# Altium footprint library Zmod.PcbLib: 229 footprints (part 13 of 15)
Each footprint in its own frame and in the unit in brackets; x right, y up, seen from the top. Pads: shape width x height; smd on the part's side, far side on the other; paste and mask are expansions set on the pad; w line width, h text height; cw(c..) or ccw(c..) is an arc to the next point about the centre after c.
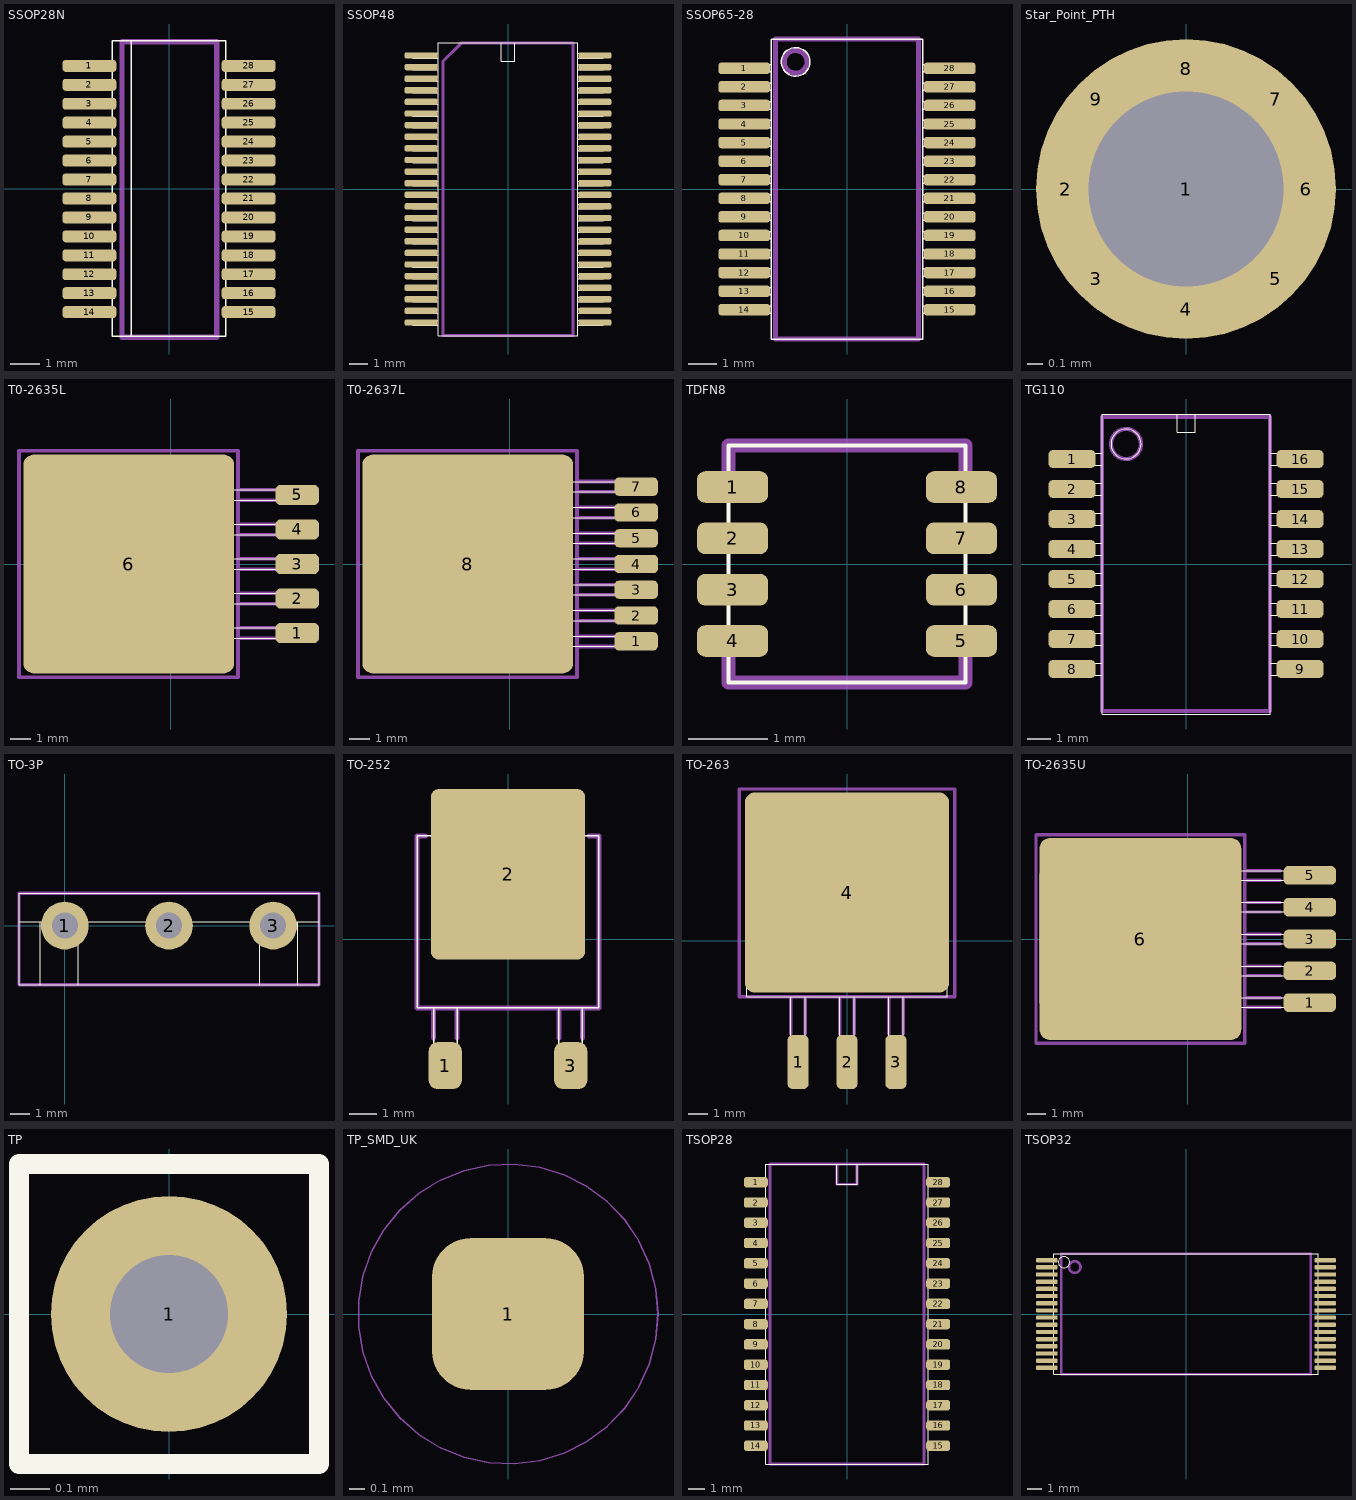
[diagram p12: the footprints below, top view; thin cyan lines are the x and y axes]

## SSOP28N [mm]
height 2.54
pads (28):
  rrect50% 1.8x0.4 smd paste+0: 1(-2.667,4.115) 2(-2.667,3.48) 3(-2.667,2.845) 4(-2.667,2.21) 5(-2.667,1.575) 6(-2.667,0.94) 7(-2.667,0.305) 8(-2.667,-0.33) 9(-2.667,-0.965) 10(-2.667,-1.6) 11(-2.667,-2.235) 12(-2.667,-2.87) 13(-2.667,-3.505) 14(-2.667,-4.14) 15(2.667,-4.14) 16(2.667,-3.505) 17(2.667,-2.87) 18(2.667,-2.235) 19(2.667,-1.6) 20(2.667,-0.965) 21(2.667,-0.33) 22(2.667,0.305) 23(2.667,0.94) 24(2.667,1.575) 25(2.667,2.21) 26(2.667,2.845) 27(2.667,3.48) 28(2.667,4.115)
Top Overlay:
  lines w0.05: -1.905,-4.267 -3.048,-4.267 -3.048,-4.013 -1.905,-4.013 ; -1.905,-3.632 -3.048,-3.632 -3.048,-3.378 -1.905,-3.378 ; -1.905,-2.997 -3.048,-2.997 -3.048,-2.743 -1.905,-2.743 ; -1.905,-2.362 -3.048,-2.362 -3.048,-2.108 -1.905,-2.108 ; -1.905,-1.727 -3.048,-1.727 -3.048,-1.473 -1.905,-1.473 ; -1.905,-1.092 -3.048,-1.092 -3.048,-0.838 -1.905,-0.838 ; -1.905,-0.457 -3.048,-0.457 -3.048,-0.203 -1.905,-0.203 ; -1.905,0.178 -3.048,0.178 -3.048,0.432 -1.905,0.432 ; -1.905,0.813 -3.048,0.813 -3.048,1.067 -1.905,1.067 ; -1.905,1.448 -3.048,1.448 -3.048,1.702 -1.905,1.702 ; -1.905,2.083 -3.048,2.083 -3.048,2.337 -1.905,2.337 ; -1.905,2.718 -3.048,2.718 -3.048,2.972 -1.905,2.972 ; -1.905,3.353 -3.048,3.353 -3.048,3.607 -1.905,3.607 ; -1.905,3.988 -3.048,3.988 -3.048,4.242 -1.905,4.242 ; -1.27,-4.953 -1.27,4.953 ; 1.905,-4.267 3.048,-4.267 3.048,-4.013 1.905,-4.013 ; 1.905,-3.632 3.048,-3.632 3.048,-3.378 1.905,-3.378 ; 1.905,-2.997 3.048,-2.997 3.048,-2.743 1.905,-2.743 ; 1.905,-2.362 3.048,-2.362 3.048,-2.108 1.905,-2.108 ; 1.905,-1.727 3.048,-1.727 3.048,-1.473 1.905,-1.473 ; 1.905,-1.092 3.048,-1.092 3.048,-0.838 1.905,-0.838 ; 1.905,-0.457 3.048,-0.457 3.048,-0.203 1.905,-0.203 ; 1.905,0.178 3.048,0.178 3.048,0.432 1.905,0.432 ; 1.905,0.813 3.048,0.813 3.048,1.067 1.905,1.067 ; 1.905,1.448 3.048,1.448 3.048,1.702 1.905,1.702 ; 1.905,2.083 3.048,2.083 3.048,2.337 1.905,2.337 ; 1.905,2.718 3.048,2.718 3.048,2.972 1.905,2.972 ; 1.905,3.353 3.048,3.353 3.048,3.607 1.905,3.607 ; 1.905,3.988 3.048,3.988 3.048,4.242 1.905,4.242 ; -1.905,-4.953 -1.905,4.953 1.905,4.953 1.905,-4.953 -1.905,-4.953
Mechanical 15:
  lines w0.18: -1.577,-4.985 1.598,-4.985 1.598,4.921 -1.577,4.921 -1.577,-4.985
  text ".Designator" at -0.381,-4.445 h1.5

## SSOP48 [mm]
height 2.54
pads (48):
  rrect50% 1.8x0.35 smd paste+0: 1(-4.75,7.315) 2(-4.75,6.68) 3(-4.75,6.045) 4(-4.75,5.41) 5(-4.75,4.775) 6(-4.75,4.14) 7(-4.75,3.505) 8(-4.75,2.87) 9(-4.75,2.235) 10(-4.75,1.6) 11(-4.75,0.965) 12(-4.75,0.33) 13(-4.75,-0.305) 14(-4.75,-0.94) 15(-4.75,-1.575) 16(-4.75,-2.21) 17(-4.75,-2.845) 18(-4.75,-3.48) 19(-4.75,-4.115) 20(-4.75,-4.75) 21(-4.75,-5.385) 22(-4.75,-6.02) 23(-4.75,-6.655) 24(-4.75,-7.29) 25(4.75,-7.29) 26(4.75,-6.655) 27(4.75,-6.02) 28(4.75,-5.385) 29(4.75,-4.75) 30(4.75,-4.115) 31(4.75,-3.48) 32(4.75,-2.845) 33(4.75,-2.21) 34(4.75,-1.575) 35(4.75,-0.94) 36(4.75,-0.305) 37(4.75,0.33) 38(4.75,0.965) 39(4.75,1.6) 40(4.75,2.235) 41(4.75,2.87) 42(4.75,3.505) 43(4.75,4.14) 44(4.75,4.775) 45(4.75,5.41) 46(4.75,6.045) 47(4.75,6.68) 48(4.75,7.315)
Top Overlay:
  drawing of 151 lines, arcs and shapes, not listed
Mechanical 15:
  lines w0.18: -3.556,-8.001 3.556,-8.001 3.556,8.001 -2.54,8.001 -3.556,6.985 -3.556,-8.001
  text ".Designator" at -1.778,-7.493 h1.5

## SSOP65-28 [mm]
height 3.048
pads (28):
  rrect50% 1.8x0.4 smd paste+0: 1(-3.6,4.225) 2(-3.6,3.575) 3(-3.6,2.925) 4(-3.6,2.275) 5(-3.6,1.625) 6(-3.6,0.975) 7(-3.6,0.325) 8(-3.6,-0.325) 9(-3.6,-0.975) 10(-3.6,-1.625) 11(-3.6,-2.275) 12(-3.6,-2.925) 13(-3.6,-3.575) 14(-3.6,-4.225) 15(3.6,-4.225) 16(3.6,-3.575) 17(3.6,-2.925) 18(3.6,-2.275) 19(3.6,-1.625) 20(3.6,-0.975) 21(3.6,-0.325) 22(3.6,0.325) 23(3.6,0.975) 24(3.6,1.625) 25(3.6,2.275) 26(3.6,2.925) 27(3.6,3.575) 28(3.6,4.225)
Top Overlay:
  circle w0.05: c-1.8,4.45 r0.5
  lines w0.05: -2.65,-4.35 -3.9,-4.35 -3.9,-4.1 -2.65,-4.1 ; -2.65,-3.7 -3.9,-3.7 -3.9,-3.45 -2.65,-3.45 ; -2.65,-3.05 -3.9,-3.05 -3.9,-2.8 -2.65,-2.8 ; -2.65,-2.4 -3.9,-2.4 -3.9,-2.15 -2.65,-2.15 ; -2.65,-1.75 -3.9,-1.75 -3.9,-1.5 -2.65,-1.5 ; -2.65,-1.1 -3.9,-1.1 -3.9,-0.85 -2.65,-0.85 ; -2.65,-0.45 -3.9,-0.45 -3.9,-0.2 -2.65,-0.2 ; -2.65,0.2 -3.9,0.2 -3.9,0.45 -2.65,0.45 ; -2.65,0.85 -3.9,0.85 -3.9,1.1 -2.65,1.1 ; -2.65,1.5 -3.9,1.5 -3.9,1.75 -2.65,1.75 ; -2.65,2.15 -3.9,2.15 -3.9,2.4 -2.65,2.4 ; -2.65,2.8 -3.9,2.8 -3.9,3.05 -2.65,3.05 ; -2.65,3.45 -3.9,3.45 -3.9,3.7 -2.65,3.7 ; -2.65,4.1 -3.9,4.1 -3.9,4.35 -2.65,4.35 ; 2.65,-4.35 3.9,-4.35 3.9,-4.1 2.65,-4.1 ; 2.65,-3.7 3.9,-3.7 3.9,-3.45 2.65,-3.45 ; 2.65,-3.05 3.9,-3.05 3.9,-2.8 2.65,-2.8 ; 2.65,-2.4 3.9,-2.4 3.9,-2.15 2.65,-2.15 ; 2.65,-1.75 3.9,-1.75 3.9,-1.5 2.65,-1.5 ; 2.65,-1.1 3.9,-1.1 3.9,-0.85 2.65,-0.85 ; 2.65,-0.45 3.9,-0.45 3.9,-0.2 2.65,-0.2 ; 2.65,0.2 3.9,0.2 3.9,0.45 2.65,0.45 ; 2.65,0.85 3.9,0.85 3.9,1.1 2.65,1.1 ; 2.65,1.5 3.9,1.5 3.9,1.75 2.65,1.75 ; 2.65,2.15 3.9,2.15 3.9,2.4 2.65,2.4 ; 2.65,2.8 3.9,2.8 3.9,3.05 2.65,3.05 ; 2.65,3.45 3.9,3.45 3.9,3.7 2.65,3.7 ; 2.65,4.1 3.9,4.1 3.9,4.35 2.65,4.35 ; -2.65,-5.25 2.65,-5.25 2.65,5.25 -2.65,5.25 -2.65,-5.25
Mechanical 15:
  circle w0.18: c-1.8,4.45 r0.4
  lines w0.18: -2.5,-5.25 -2.5,5.25 2.5,5.25 2.5,-5.25 -2.5,-5.25
  text ".Designator" at -1.143,-4.826 h1.5

## Star_Point_PTH [mm] "Star Point  Rev. 2"
height 0.01
pads (9):
  round 2 hole 1.3: 1(0,0)
  round 0.3 all layers, no hole: 2(-0.8,0) 3(-0.6,-0.6) 4(0,-0.8) 5(0.6,-0.6) 6(0.8,0) 7(0.6,0.6) 8(0,0.8) 9(-0.6,0.6)
Mechanical 15:
  text ".Designator" at 0,0 h1.5

## T0-2635L [mm]
height 4.699
pads (6):
  rrect50% 2.15x1 smd: 1(6.223,-3.404) 2(6.223,-1.702) 3(6.223,0) 4(6.223,1.702) 5(6.223,3.404)
  rrect10% 10.4x10.8 smd: 6(-2.083,0)
Top Overlay:
  circle w0.05: c1.905,-4.064 r0.635
  lines w0.05: -5.893,-5.08 -5.893,5.08 ; 2.997,-3.658 7.188,-3.658 7.188,-3.15 2.997,-3.15 ; 2.997,-1.956 7.188,-1.956 7.188,-1.448 2.997,-1.448 ; 2.997,-0.254 7.188,-0.254 7.188,0.254 2.997,0.254 ; 2.997,1.448 7.188,1.448 7.188,1.956 2.997,1.956 ; 2.997,3.15 7.188,3.15 7.188,3.658 2.997,3.658 ; -7.163,-3.429 -6.782,-5.08 2.997,-5.08 2.997,5.08 -6.782,5.08 -7.163,3.429 -7.163,-3.429
Mechanical 15:
  lines w0.18: 3.302,-3.658 5.207,-3.658 ; 3.302,-3.15 5.207,-3.15 ; 3.302,-1.956 5.207,-1.956 ; 3.302,-1.448 5.207,-1.448 ; 3.302,-0.254 5.207,-0.254 ; 3.302,0.254 5.207,0.254 ; 3.302,1.448 5.207,1.448 ; 3.302,1.956 5.207,1.956 ; 3.302,3.15 5.207,3.15 ; 3.302,3.658 5.207,3.658 ; -7.493,-5.588 -7.493,5.588 3.302,5.588 3.302,-5.588 -7.493,-5.588
  text ".Designator" at -7.1,3.5 h1.5

## T0-2637L [mm]
height 4.699
pads (8):
  rrect50% 2.15x0.9 smd: 1(6.223,-3.81) 2(6.223,-2.54) 3(6.223,-1.27) 4(6.223,0) 5(6.223,1.27) 6(6.223,2.54) 7(6.223,3.81)
  rrect10% 10.4x10.8 smd: 8(-2.083,0)
Top Overlay:
  circle w0.05: c1.905,-4.064 r0.635
  lines w0.05: -5.893,-5.08 -5.893,5.08 ; 2.997,-4.064 7.188,-4.064 7.188,-3.556 2.997,-3.556 ; 2.997,-2.794 7.188,-2.794 7.188,-2.286 2.997,-2.286 ; 2.997,-1.524 7.188,-1.524 7.188,-1.016 2.997,-1.016 ; 2.997,-0.254 7.188,-0.254 7.188,0.254 2.997,0.254 ; 2.997,1.016 7.188,1.016 7.188,1.524 2.997,1.524 ; 2.997,2.286 7.188,2.286 7.188,2.794 2.997,2.794 ; 2.997,3.556 7.188,3.556 7.188,4.064 2.997,4.064 ; -7.163,-3.429 -6.782,-5.08 2.997,-5.08 2.997,5.08 -6.782,5.08 -7.163,3.429 -7.163,-3.429
Mechanical 15:
  lines w0.18: 3.302,-4.064 5.207,-4.064 ; 3.302,-3.556 5.207,-3.556 ; 3.302,-2.794 5.207,-2.794 ; 3.302,-2.286 5.207,-2.286 ; 3.302,-1.524 5.207,-1.524 ; 3.302,-1.016 5.207,-1.016 ; 3.302,-0.254 5.207,-0.254 ; 3.302,0.254 5.207,0.254 ; 3.302,1.016 5.207,1.016 ; 3.302,1.524 5.207,1.524 ; 3.302,2.286 5.207,2.286 ; 3.302,2.794 5.207,2.794 ; 3.302,3.556 5.207,3.556 ; 3.302,4.064 5.207,4.064 ; -7.493,-5.588 -7.493,5.588 3.302,5.588 3.302,-5.588 -7.493,-5.588
  text ".Designator" at -6.75,3.4 h1.5

## TDFN8 [mm]
height 1.905
pads (8):
  rrect50% 0.9x0.4 smd paste+0: 1(-1.45,0.975) 2(-1.45,0.325) 3(-1.45,-0.325) 4(-1.45,-0.975) 5(1.45,-0.975) 6(1.45,-0.325) 7(1.45,0.325) 8(1.45,0.975)
Top Overlay:
  lines w0.05: -1.5,-1.5 1.5,-1.5 1.5,1.5 -1.5,1.5 -1.5,-1.5
Mechanical 15:
  lines w0.18: -1.5,-1.2 -1.5,-1.5 1.5,-1.5 1.5,-1.2 ; -1.5,1.2 -1.5,1.5 1.5,1.5 1.5,1.2
  text ".Designator" at -1.397,0.381 h1.5

## TG110 [mm]
height 2.54
pads (16):
  rrect50% 2x0.75 smd paste+0: 1(-4.826,4.445) 2(-4.826,3.175) 3(-4.826,1.905) 4(-4.826,0.635) 5(-4.826,-0.635) 6(-4.826,-1.905) 7(-4.826,-3.175) 8(-4.826,-4.445) 9(4.826,-4.445) 10(4.826,-3.175) 11(4.826,-1.905) 12(4.826,-0.635) 13(4.826,0.635) 14(4.826,1.905) 15(4.826,3.175) 16(4.826,4.445)
Top Overlay:
  circle w0.05: c-2.54,5.08 r0.635
  lines w0.05: -3.556,-4.699 -4.826,-4.699 -4.826,-4.191 -3.556,-4.191 ; -3.556,-3.429 -4.826,-3.429 -4.826,-2.921 -3.556,-2.921 ; -3.556,-2.159 -4.826,-2.159 -4.826,-1.651 -3.556,-1.651 ; -3.556,-0.889 -4.826,-0.889 -4.826,-0.381 -3.556,-0.381 ; -3.556,0.381 -4.826,0.381 -4.826,0.889 -3.556,0.889 ; -3.556,1.651 -4.826,1.651 -4.826,2.159 -3.556,2.159 ; -3.556,2.921 -4.826,2.921 -4.826,3.429 -3.556,3.429 ; -3.556,4.191 -4.826,4.191 -4.826,4.699 -3.556,4.699 ; -0.381,6.35 -0.381,5.588 0.381,5.588 0.381,6.35 ; 3.556,-4.699 4.826,-4.699 4.826,-4.191 3.556,-4.191 ; 3.556,-3.429 4.826,-3.429 4.826,-2.921 3.556,-2.921 ; 3.556,-2.159 4.826,-2.159 4.826,-1.651 3.556,-1.651 ; 3.556,-0.889 4.826,-0.889 4.826,-0.381 3.556,-0.381 ; 3.556,0.381 4.826,0.381 4.826,0.889 3.556,0.889 ; 3.556,1.651 4.826,1.651 4.826,2.159 3.556,2.159 ; 3.556,2.921 4.826,2.921 4.826,3.429 3.556,3.429 ; 3.556,4.191 4.826,4.191 4.826,4.699 3.556,4.699 ; -3.556,-6.35 -3.556,6.35 3.556,6.35 3.556,-6.35 -3.556,-6.35
Mechanical 15:
  circle w0.18: c-2.54,5.08 r0.635
  lines w0.18: -3.556,-6.223 -3.556,6.223 3.556,6.223 3.556,-6.223 -3.556,-6.223
  text ".Designator" at -1.651,-5.334 h1.5

## TO-3P [mm] "Fairchild Package TO-3P"
height 24
pads (3):
  round 2.5 / inner round 1.35 / far side round 2.5 hole 1.35: 1(0,0) 2(5.45,0) 3(10.9,0)
Top Overlay:
  lines w0.05: -2.4,0.2 0.7,0.2 ; -1.3,-3.1 -1.3,0.2 ; 10.2,-3.1 10.2,0.2 ; 12.2,-3.1 12.2,0.2 ; 13.3,0.2 0.7,0.2 ; 0.7,-3.1 13.3,-3.1 13.3,1.7 -2.4,1.7 -2.4,-3.1 0.7,-3.1 ; 0.7,-3.1 0.7,0.2
Mechanical 15:
  lines w0.18: -2.4,-3.1 13.3,-3.1 13.3,1.7 -2.4,1.7 -2.4,-3.1
  text ".Designator" at -1.7,-2.3 h1.5

## TO-252 [mm]
height 2.413
pads (3):
  rrect50% 1.2x1.7 smd: 1(-2.28,-4.6) 3(2.28,-4.6)
  rrect10% 5.6x6.2 smd: 2(0,2.35)
Top Overlay:
  lines w0.05: -2.7,-4.1 -1.85,-4.1 ; -2.7,-2.5 -2.7,-4.95 -1.85,-4.95 -1.85,-2.5 ; -2.7,3.75 -2.7,4.95 -2,4.95 -2,4.6 2,4.6 2,4.95 2.7,4.95 2.7,3.75 ; 1.85,-4.1 2.7,-4.1 ; 1.85,-2.5 1.85,-4.95 2.7,-4.95 2.7,-2.5 ; -3.3,-2.5 3.3,-2.5 3.3,3.75 -3.3,3.75 -3.3,-2.5
Mechanical 15:
  lines w0.18: -3,3.75 -3.3,3.75 -3.3,-2.5 3.3,-2.5 3.3,3.75 2.95,3.75 ; -2.7,-3.6 -2.7,-2.5 ; -1.85,-3.6 -1.85,-2.5 ; 1.85,-3.6 1.85,-2.5 ; 2.7,-3.6 2.7,-2.5
  text ".Designator" at -3.4,2.45 h1.5

## TO-263 [mm]
height 4.699
pads (4):
  rrect50% 1.1x2.8 smd: 1(-2.54,-6.3) 2(0,-6.3) 3(2.54,-6.3)
  rrect10% 10.6x10.4 smd: 4(0,2.5)
Top Overlay:
  lines w0.05: -2.921,-2.921 -2.921,-7.239 -2.159,-7.239 -2.159,-2.921 ; -0.381,-2.921 -0.381,-7.239 0.381,-7.239 0.381,-2.921 ; 2.159,-2.921 2.159,-7.239 2.921,-7.239 2.921,-2.921 ; -5.207,5.969 5.207,5.969 ; -5.207,5.969 -5.207,-2.921 5.207,-2.921 5.207,5.969 ; -5.207,5.969 -5.207,6.858 -4.318,7.239 4.318,7.239 5.207,6.858 5.207,5.969
Mechanical 15:
  lines w0.18: -2.921,-4.826 -2.921,-2.921 ; -2.159,-4.826 -2.159,-2.921 ; -0.381,-4.826 -0.381,-2.921 ; 0.381,-4.826 0.381,-2.921 ; 2.159,-4.826 2.159,-2.921 ; 2.921,-4.826 2.921,-2.921 ; -5.588,-2.921 5.588,-2.921 5.588,7.874 -5.588,7.874 -5.588,-2.921
  text ".Designator" at -5.1,5.1 h1.5

## TO-2635U [mm]
height 4.699
pads (6):
  rrect50% 2.8x1 smd: 1(6.528,-3.404) 2(6.528,-1.702) 3(6.528,0) 4(6.528,1.702) 5(6.528,3.404)
  rrect10% 10.8x10.8 smd: 6(-2.54,0)
Top Overlay:
  circle w0.05: c1.422,-4.064 r0.635
  lines w0.05: -6.629,-5.08 -6.629,5.08 ; 2.769,-3.658 7.874,-3.658 7.874,-3.15 2.769,-3.15 ; 2.769,-1.956 7.874,-1.956 7.874,-1.448 2.769,-1.448 ; 2.769,-0.254 7.874,-0.254 7.874,0.254 2.769,0.254 ; 2.769,1.448 7.874,1.448 7.874,1.956 2.769,1.956 ; 2.769,3.15 7.874,3.15 7.874,3.658 2.769,3.658 ; -7.899,-3.429 -7.518,-5.08 2.769,-5.08 2.769,5.08 -7.518,5.08 -7.899,3.429 -7.899,-3.429
Mechanical 15:
  lines w0.18: 3.048,-3.658 4.953,-3.658 ; 3.048,-3.15 4.953,-3.15 ; 3.048,-1.956 4.953,-1.956 ; 3.048,-1.448 4.953,-1.448 ; 3.048,-0.254 4.953,-0.254 ; 3.048,0.254 4.953,0.254 ; 3.048,1.448 4.953,1.448 ; 3.048,1.956 4.953,1.956 ; 3.048,3.15 4.953,3.15 ; 3.048,3.658 4.953,3.658 ; -8.128,-5.588 -8.128,5.588 3.048,5.588 3.048,-5.588 -8.128,-5.588
  text ".Designator" at -6.85,2.85 h1.5

## TP [mm]
pads (1):
  round 0.6 / inner round 0.3 / far side round 0.6 hole 0.3: 1(0,0)
Top Overlay:
  lines w0.05: -0.381,-0.381 -0.381,0.381 0.381,0.381 0.381,-0.381 -0.381,-0.381
Mechanical 15:
  text ".Designator" at -0.508,0.127 h1.5

## TP_SMD_UK [mm] "Test Probe UK - as per AP-3-5057 Rev. 3"
height 0.1
pads (1):
  rrect50% 1x1 smd: 1(0,0)
Mechanical 13:
  circle w0.01: c0,0 r0.99
Mechanical 15:
  text ".Designator" at -0.5,0.2 h1.5
3D body: height 0.1, standoff 0, extent -0.989,-0.989 0.989,0.989

## TSOP28 [mm]
height 1.27
pads (28):
  rrect50% 1.5x0.65 smd paste+0: 1(-5.715,8.255) 2(-5.715,6.985) 3(-5.715,5.715) 4(-5.715,4.445) 5(-5.715,3.175) 6(-5.715,1.905) 7(-5.715,0.635) 8(-5.715,-0.635) 9(-5.715,-1.905) 10(-5.715,-3.175) 11(-5.715,-4.445) 12(-5.715,-5.715) 13(-5.715,-6.985) 14(-5.715,-8.255) 15(5.715,-8.255) 16(5.715,-6.985) 17(5.715,-5.715) 18(5.715,-4.445) 19(5.715,-3.175) 20(5.715,-1.905) 21(5.715,-0.635) 22(5.715,0.635) 23(5.715,1.905) 24(5.715,3.175) 25(5.715,4.445) 26(5.715,5.715) 27(5.715,6.985) 28(5.715,8.255)
Top Overlay:
  lines w0.05: -5.08,-8.458 -5.969,-8.458 -5.969,-8.052 -5.08,-8.052 ; -5.08,-7.188 -5.969,-7.188 -5.969,-6.782 -5.08,-6.782 ; -5.08,-5.918 -5.969,-5.918 -5.969,-5.512 -5.08,-5.512 ; -5.08,-4.648 -5.969,-4.648 -5.969,-4.242 -5.08,-4.242 ; -5.08,-3.378 -5.969,-3.378 -5.969,-2.972 -5.08,-2.972 ; -5.08,-2.108 -5.969,-2.108 -5.969,-1.702 -5.08,-1.702 ; -5.08,-0.838 -5.969,-0.838 -5.969,-0.432 -5.08,-0.432 ; -5.08,0.432 -5.969,0.432 -5.969,0.838 -5.08,0.838 ; -5.08,1.702 -5.969,1.702 -5.969,2.108 -5.08,2.108 ; -5.08,2.972 -5.969,2.972 -5.969,3.378 -5.08,3.378 ; -5.08,4.242 -5.969,4.242 -5.969,4.648 -5.08,4.648 ; -5.08,5.512 -5.969,5.512 -5.969,5.918 -5.08,5.918 ; -5.08,6.782 -5.969,6.782 -5.969,7.188 -5.08,7.188 ; -5.08,8.052 -5.969,8.052 -5.969,8.458 -5.08,8.458 ; -0.635,9.398 -0.635,8.128 0.635,8.128 0.635,9.398 ; 5.08,-8.458 5.969,-8.458 5.969,-8.052 5.08,-8.052 ; 5.08,-7.188 5.969,-7.188 5.969,-6.782 5.08,-6.782 ; 5.08,-5.918 5.969,-5.918 5.969,-5.512 5.08,-5.512 ; 5.08,-4.648 5.969,-4.648 5.969,-4.242 5.08,-4.242 ; 5.08,-3.378 5.969,-3.378 5.969,-2.972 5.08,-2.972 ; 5.08,-2.108 5.969,-2.108 5.969,-1.702 5.08,-1.702 ; 5.08,-0.838 5.969,-0.838 5.969,-0.432 5.08,-0.432 ; 5.08,0.432 5.969,0.432 5.969,0.838 5.08,0.838 ; 5.08,1.702 5.969,1.702 5.969,2.108 5.08,2.108 ; 5.08,2.972 5.969,2.972 5.969,3.378 5.08,3.378 ; 5.08,4.242 5.969,4.242 5.969,4.648 5.08,4.648 ; 5.08,5.512 5.969,5.512 5.969,5.918 5.08,5.918 ; 5.08,6.782 5.969,6.782 5.969,7.188 5.08,7.188 ; 5.08,8.052 5.969,8.052 5.969,8.458 5.08,8.458 ; -5.08,-9.398 -5.08,9.398 5.08,9.398 5.08,-9.398 -5.08,-9.398
Mechanical 15:
  lines w0.18: -0.635,9.398 -0.635,8.128 0.635,8.128 0.635,9.398 ; -4.826,-9.398 -4.826,9.398 4.826,9.398 4.826,-9.398 -4.826,-9.398
  text ".Designator" at -2.921,-8.128 h1.5

## TSOP32 [mm]
height 1.27
pads (32):
  rrect50% 1.5x0.3 smd paste+0: 1(-9.7,3.75) 2(-9.7,3.25) 3(-9.7,2.75) 4(-9.7,2.25) 5(-9.7,1.75) 6(-9.7,1.25) 7(-9.7,0.75) 8(-9.7,0.25) 9(-9.7,-0.25) 10(-9.7,-0.75) 11(-9.7,-1.25) 12(-9.7,-1.75) 13(-9.7,-2.25) 14(-9.7,-2.75) 15(-9.7,-3.25) 16(-9.7,-3.75) 17(9.7,-3.75) 18(9.7,-3.25) 19(9.7,-2.75) 20(9.7,-2.25) 21(9.7,-1.75) 22(9.7,-1.25) 23(9.7,-0.75) 24(9.7,-0.25) 25(9.7,0.25) 26(9.7,0.75) 27(9.7,1.25) 28(9.7,1.75) 29(9.7,2.25) 30(9.7,2.75) 31(9.7,3.25) 32(9.7,3.75)
Top Overlay:
  lines w0.05: -9.2,-3.8 -9.8,-3.8 -9.8,-3.7 -9.2,-3.7 ; -9.2,-3.3 -9.8,-3.3 -9.8,-3.2 -9.2,-3.2 ; -9.2,-2.8 -9.8,-2.8 -9.8,-2.7 -9.2,-2.7 ; -9.2,-2.3 -9.8,-2.3 -9.8,-2.2 -9.2,-2.2 ; -9.2,-1.8 -9.8,-1.8 -9.8,-1.7 -9.2,-1.7 ; -9.2,-1.3 -9.8,-1.3 -9.8,-1.2 -9.2,-1.2 ; -9.2,-0.8 -9.8,-0.8 -9.8,-0.7 -9.2,-0.7 ; -9.2,-0.3 -9.8,-0.3 -9.8,-0.2 -9.2,-0.2 ; -9.2,0.2 -9.8,0.2 -9.8,0.3 -9.2,0.3 ; -9.2,0.7 -9.8,0.7 -9.8,0.8 -9.2,0.8 ; -9.2,1.2 -9.8,1.2 -9.8,1.3 -9.2,1.3 ; -9.2,1.7 -9.8,1.7 -9.8,1.8 -9.2,1.8 ; -9.2,2.2 -9.8,2.2 -9.8,2.3 -9.2,2.3 ; -9.2,2.7 -9.8,2.7 -9.8,2.8 -9.2,2.8 ; -9.2,3.2 -9.8,3.2 -9.8,3.3 -9.2,3.3 ; -9.2,3.7 -9.8,3.7 -9.8,3.8 -9.2,3.8 ; -8.9,3.6 cw(c-8.5,3.6) -8.1,3.6 ; -8.896,3.62 ccw(c-8.496,3.62) -8.096,3.62 ; 9.2,-3.8 9.8,-3.8 9.8,-3.7 9.2,-3.7 ; 9.2,-3.3 9.8,-3.3 9.8,-3.2 9.2,-3.2 ; 9.2,-2.8 9.8,-2.8 9.8,-2.7 9.2,-2.7 ; 9.2,-2.3 9.8,-2.3 9.8,-2.2 9.2,-2.2 ; 9.2,-1.8 9.8,-1.8 9.8,-1.7 9.2,-1.7 ; 9.2,-1.3 9.8,-1.3 9.8,-1.2 9.2,-1.2 ; 9.2,-0.8 9.8,-0.8 9.8,-0.7 9.2,-0.7 ; 9.2,-0.3 9.8,-0.3 9.8,-0.2 9.2,-0.2 ; 9.2,0.2 9.8,0.2 9.8,0.3 9.2,0.3 ; 9.2,0.7 9.8,0.7 9.8,0.8 9.2,0.8 ; 9.2,1.2 9.8,1.2 9.8,1.3 9.2,1.3 ; 9.2,1.7 9.8,1.7 9.8,1.8 9.2,1.8 ; 9.2,2.2 9.8,2.2 9.8,2.3 9.2,2.3 ; 9.2,2.7 9.8,2.7 9.8,2.8 9.2,2.8 ; 9.2,3.2 9.8,3.2 9.8,3.3 9.2,3.3 ; 9.2,3.7 9.8,3.7 9.8,3.8 9.2,3.8 ; -9.2,-4.2 9.2,-4.2 9.2,4.2 -9.2,4.2 -9.2,-4.2
Mechanical 15:
  lines w0.18: -8.151,3.265 ccw(c-7.751,3.265) -7.351,3.265 ; -8.146,3.27 cw(c-7.746,3.27) -7.346,3.27 ; -8.7,-4.2 8.7,-4.2 8.7,4.2 -8.7,4.2 -8.7,-4.2
  text ".Designator" at -6.35,2.54 h1.5